# Altium footprint library General.PcbLib: 446 footprints (part 20 of 28)
Each footprint in its own frame and in the unit in brackets; x right, y up, seen from the top. Pads: shape width x height; smd on the part's side, far side on the other; paste and mask are expansions set on the pad; w line width, h text height; cw(c..) or ccw(c..) is an arc to the next point about the centre after c.
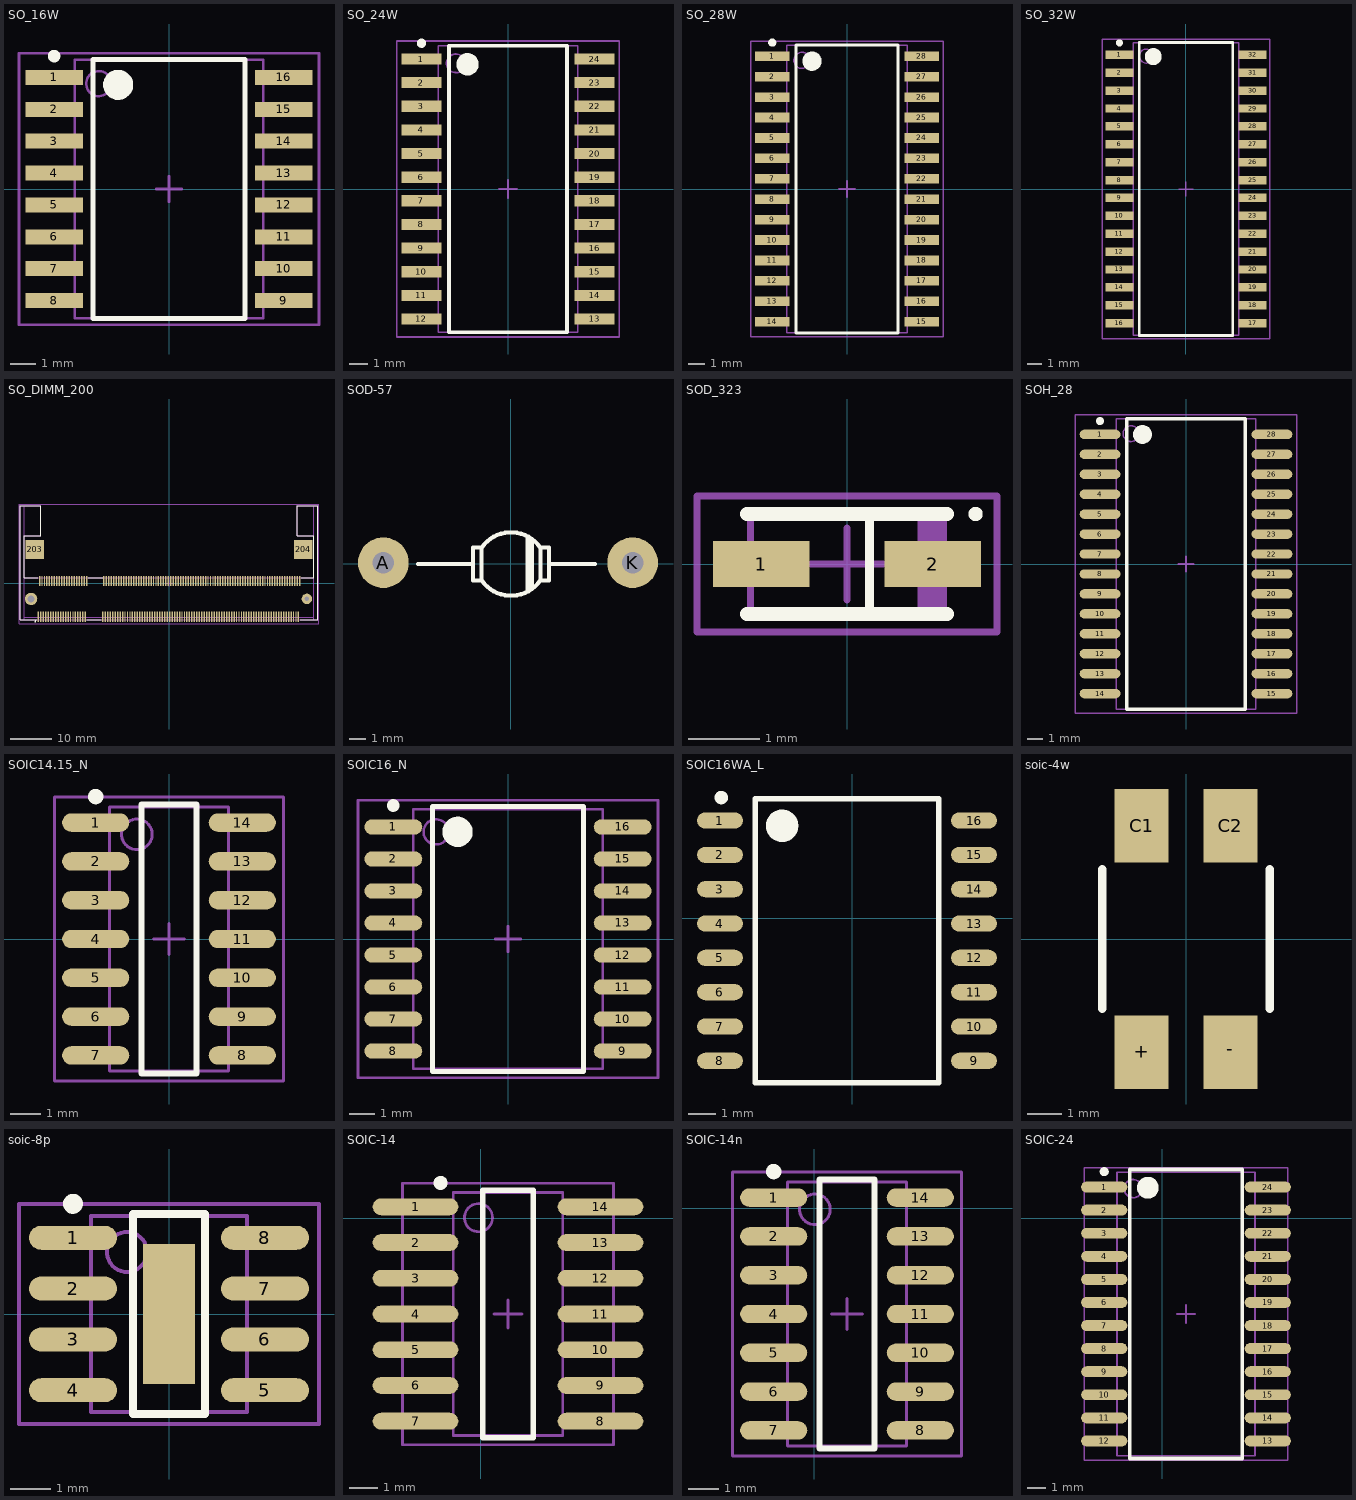
[diagram p19: the footprints below, top view; thin cyan lines are the x and y axes]

## SO_16W [mm] "SOIC, 16-Leads, Body 10.3x7.5mm (max), Pitch 1.27mm, IPC Medium Density"
height 2.4
pads (16):
  rect 2.3x0.6 smd: 1(-4.575,4.445) 2(-4.575,3.175) 3(-4.575,1.905) 4(-4.575,0.635) 5(-4.575,-0.635) 6(-4.575,-1.905) 7(-4.575,-3.175) 8(-4.575,-4.445) 9(4.575,-4.445) 10(4.575,-3.175) 11(4.575,-1.905) 12(4.575,-0.635) 13(4.575,0.635) 14(4.575,1.905) 15(4.575,3.175) 16(4.575,4.445)
Top Overlay:
  circle w0.6: c-2.025,4.15 r0.3
  circle w0.25: c-4.575,5.295 r0.125
  lines w0.2: -3.025,-5.15 3.025,-5.15 3.025,5.15 -3.025,5.15 -3.025,-5.15
Mechanical 13:
  circle w0.1: c-2.8,4.2 r0.5
  lines w0.1: -3.75,-5.15 3.75,-5.15 3.75,5.15 -3.75,5.15 -3.75,-5.15
Mechanical 15:
  lines w0.1: -0.5,0 0.5,0 ; 0,-0.5 0,0.5 ; -5.975,-5.4 5.975,-5.4 5.975,5.4 -5.975,5.4 -5.975,-5.4
3D body "SW3DPS-SOL-16-DEFAULT.STEP": height 1.75, standoff 0, extent -4.648,-4.851 4.652,5.149

## SO_24W [mm] "SOIC, 24-Leads, Body 15.4x7.5mm (max), Pitch 1.27mm, IPC Medium Density"
height 2.4
pads (24):
  rect 2.15x0.6 smd: 1(-4.65,6.985) 2(-4.65,5.715) 3(-4.65,4.445) 4(-4.65,3.175) 5(-4.65,1.905) 6(-4.65,0.635) 7(-4.65,-0.635) 8(-4.65,-1.905) 9(-4.65,-3.175) 10(-4.65,-4.445) 11(-4.65,-5.715) 12(-4.65,-6.985) 13(4.65,-6.985) 14(4.65,-5.715) 15(4.65,-4.445) 16(4.65,-3.175) 17(4.65,-1.905) 18(4.65,-0.635) 19(4.65,0.635) 20(4.65,1.905) 21(4.65,3.175) 22(4.65,4.445) 23(4.65,5.715) 24(4.65,6.985)
Top Overlay:
  circle w0.25: c-4.65,7.835 r0.125
  circle w0.6: c-2.175,6.7 r0.3
  lines w0.2: -3.175,-7.7 -3.175,7.7 3.175,7.7 3.175,-7.7 -3.175,-7.7
Mechanical 13:
  circle w0.1: c-2.8,6.75 r0.5
  lines w0.1: -3.75,-7.7 -3.75,7.7 3.75,7.7 3.75,-7.7 -3.75,-7.7
Mechanical 15:
  lines w0.1: -0.5,0 0.5,0 ; 0,-0.5 0,0.5 ; -5.975,-7.95 -5.975,7.95 5.975,7.95 5.975,-7.95 -5.975,-7.95
3D body: height 2.4, standoff 0.2, extent -3.75,-7.7 3.75,7.7

## SO_28W [mm] "SOIC, 28-Leads, Body 17.9x7.5mm (max), Pitch 1.27mm, IPC Medium Density"
height 1.75
pads (28):
  rect 2.15x0.6 smd: 1(-4.65,8.255) 2(-4.65,6.985) 3(-4.65,5.715) 4(-4.65,4.445) 5(-4.65,3.175) 6(-4.65,1.905) 7(-4.65,0.635) 8(-4.65,-0.635) 9(-4.65,-1.905) 10(-4.65,-3.175) 11(-4.65,-4.445) 12(-4.65,-5.715) 13(-4.65,-6.985) 14(-4.65,-8.255) 15(4.65,-8.255) 16(4.65,-6.985) 17(4.65,-5.715) 18(4.65,-4.445) 19(4.65,-3.175) 20(4.65,-1.905) 21(4.65,-0.635) 22(4.65,0.635) 23(4.65,1.905) 24(4.65,3.175) 25(4.65,4.445) 26(4.65,5.715) 27(4.65,6.985) 28(4.65,8.255)
Top Overlay:
  circle w0.6: c-2.175,7.95 r0.3
  circle w0.25: c-4.65,9.105 r0.125
  lines w0.2: -3.175,-8.95 3.175,-8.95 3.175,8.95 -3.175,8.95 -3.175,-8.95
Mechanical 13:
  circle w0.1: c-2.8,8 r0.5
  lines w0.1: -3.75,-8.95 3.75,-8.95 3.75,8.95 -3.75,8.95 -3.75,-8.95
Mechanical 15:
  lines w0.1: -0.5,0 0.5,0 ; 0,-0.5 0,0.5 ; -5.975,-9.2 5.975,-9.2 5.975,9.2 -5.975,9.2 -5.975,-9.2
3D body "SW3DPS-SOL-28-DEFAULT.STEP": height 1.75, standoff 0, extent -4.623,-8.814 4.677,8.946

## SO_32W [mm] "SOIC, 32-Leads, Body 20.8x7.5mm (max), Pitch 1.27mm, IPC Medium Density"
height 2.413
pads (32):
  rect 2x0.6 smd: 1(-4.725,9.525) 2(-4.725,8.255) 3(-4.725,6.985) 4(-4.725,5.715) 5(-4.725,4.445) 6(-4.725,3.175) 7(-4.725,1.905) 8(-4.725,0.635) 9(-4.725,-0.635) 10(-4.725,-1.905) 11(-4.725,-3.175) 12(-4.725,-4.445) 13(-4.725,-5.715) 14(-4.725,-6.985) 15(-4.725,-8.255) 16(-4.725,-9.525) 17(4.725,-9.525) 18(4.725,-8.255) 19(4.725,-6.985) 20(4.725,-5.715) 21(4.725,-4.445) 22(4.725,-3.175) 23(4.725,-1.905) 24(4.725,-0.635) 25(4.725,0.635) 26(4.725,1.905) 27(4.725,3.175) 28(4.725,4.445) 29(4.725,5.715) 30(4.725,6.985) 31(4.725,8.255) 32(4.725,9.525)
Top Overlay:
  circle w0.25: c-4.725,10.375 r0.125
  circle w0.6: c-2.325,9.4 r0.3
  lines w0.2: -3.325,-10.4 -3.325,10.4 3.325,10.4 3.325,-10.4 -3.325,-10.4
Mechanical 13:
  circle w0.1: c-2.81,9.44 r0.5
  lines w0.1: -3.76,-10.39 -3.76,10.39 3.76,10.39 3.76,-10.39 -3.76,-10.39
Mechanical 15:
  lines w0.1: -0.5,0 0.5,0 ; 0,-0.5 0,0.5 ; -5.95,-10.65 -5.95,10.65 5.95,10.65 5.95,-10.65 -5.95,-10.65
3D body: height 2.41, standoff 0.18, extent -3.76,-10.39 3.76,10.39

## SO_DIMM_200 [mm] "Connector; DMD Series; 200 Position; 0.6mm Spaced Top Contact"
height 5.2
pads (204):
  rect 0.35x2.5 smd: 1(-31.65,-8.175) 2(-31.35,0.525) 3(-31.05,-8.175) 4(-30.75,0.525) 5(-30.45,-8.175) 6(-30.15,0.525) 7(-29.85,-8.175) 8(-29.55,0.525) 9(-29.25,-8.175) 10(-28.95,0.525) 11(-28.65,-8.175) 12(-28.35,0.525) 13(-28.05,-8.175) 14(-27.75,0.525) 15(-27.45,-8.175) 16(-27.15,0.525) 17(-26.85,-8.175) 18(-26.55,0.525) 19(-26.25,-8.175) 20(-25.95,0.525) 21(-25.65,-8.175) 22(-25.35,0.525) 23(-25.05,-8.175) 24(-24.75,0.525) 25(-24.45,-8.175) 26(-24.15,0.525) 27(-23.85,-8.175) 28(-23.55,0.525) 29(-23.25,-8.175) 30(-22.95,0.525) 31(-22.65,-8.175) 32(-22.35,0.525) 33(-22.05,-8.175) 34(-21.75,0.525) 35(-21.45,-8.175) 36(-21.15,0.525) 37(-20.85,-8.175) 38(-20.55,0.525) 39(-20.25,-8.175) 40(-19.95,0.525) 41(-16.05,-8.175) 42(-15.75,0.525) 43(-15.45,-8.175) 44(-15.15,0.525) 45(-14.85,-8.175) 46(-14.55,0.525) 47(-14.25,-8.175) 48(-13.95,0.525) 49(-13.65,-8.175) 50(-13.35,0.525) 51(-13.05,-8.175) 52(-12.75,0.525) 53(-12.45,-8.175) 54(-12.15,0.525) 55(-11.85,-8.175) 56(-11.55,0.525) 57(-11.25,-8.175) 58(-10.95,0.525) 59(-10.65,-8.175) 60(-10.35,0.525) 61(-10.05,-8.175) 62(-9.75,0.525) 63(-9.45,-8.175) 64(-9.15,0.525) 65(-8.85,-8.175) 66(-8.55,0.525) 67(-8.25,-8.175) 68(-7.95,0.525) 69(-7.65,-8.175) 70(-7.35,0.525) 71(-7.05,-8.175) 72(-6.75,0.525) 73(-6.45,-8.175) 74(-6.15,0.525) 75(-5.85,-8.175) 76(-5.55,0.525) 77(-5.25,-8.175) 78(-4.95,0.525) 79(-4.65,-8.175) 80(-4.35,0.525) 81(-4.05,-8.175) 82(-3.75,0.525) 83(-3.45,-8.175) 84(-3.15,0.525) 85(-2.85,-8.175) 86(-2.55,0.525) 87(-2.25,-8.175) 88(-1.95,0.525) 89(-1.65,-8.175) 90(-1.35,0.525) 91(-1.05,-8.175) 92(-0.75,0.525) 93(-0.45,-8.175) 94(-0.15,0.525) 95(0.15,-8.175) 96(0.45,0.525) 97(0.75,-8.175) 98(1.05,0.525) 99(1.35,-8.175) 100(1.65,0.525) 101(1.95,-8.175) 102(2.25,0.525) 103(2.55,-8.175) 104(2.85,0.525) 105(3.15,-8.175) 106(3.45,0.525) 107(3.75,-8.175) 108(4.05,0.525) 109(4.35,-8.175) 110(4.65,0.525) 111(4.95,-8.175) 112(5.25,0.525) 113(5.55,-8.175) 114(5.85,0.525) 115(6.15,-8.175) 116(6.45,0.525) 117(6.75,-8.175) 118(7.05,0.525) 119(7.35,-8.175) 120(7.65,0.525) 121(7.95,-8.175) 122(8.25,0.525) 123(8.55,-8.175) 124(8.85,0.525) 125(9.15,-8.175) 126(9.45,0.525) 127(9.75,-8.175) 128(10.05,0.525) 129(10.35,-8.175) 130(10.65,0.525) 131(10.95,-8.175) 132(11.25,0.525) 133(11.55,-8.175) 134(11.85,0.525) 135(12.15,-8.175) 136(12.45,0.525) 137(12.75,-8.175) 138(13.05,0.525) 139(13.35,-8.175) 140(13.65,0.525) 141(13.95,-8.175) 142(14.25,0.525) 143(14.55,-8.175) 144(14.85,0.525) 145(15.15,-8.175) 146(15.45,0.525) 147(15.75,-8.175) 148(16.05,0.525) 149(16.35,-8.175) 150(16.65,0.525) 151(16.95,-8.175) 152(17.25,0.525) 153(17.55,-8.175) 154(17.85,0.525) 155(18.15,-8.175) 156(18.45,0.525) 157(18.75,-8.175) 158(19.05,0.525) 159(19.35,-8.175) 160(19.65,0.525) 161(19.95,-8.175) 162(20.25,0.525) 163(20.55,-8.175) 164(20.85,0.525) 165(21.15,-8.175) 166(21.45,0.525) 167(21.75,-8.175) 168(22.05,0.525) 169(22.35,-8.175) 170(22.65,0.525) 171(22.95,-8.175) 172(23.25,0.525) 173(23.55,-8.175) 174(23.85,0.525) 175(24.15,-8.175) 176(24.45,0.525) 177(24.75,-8.175) 178(25.05,0.525) 179(25.35,-8.175) 180(25.65,0.525) 181(25.95,-8.175) 182(26.25,0.525) 183(26.55,-8.175) 184(26.85,0.525) 185(27.15,-8.175) 186(27.45,0.525) 187(27.75,-8.175) 188(28.05,0.525) 189(28.35,-8.175) 190(28.65,0.525) 191(28.95,-8.175) 192(29.25,0.525) 193(29.55,-8.175) 194(29.85,0.525) 195(30.15,-8.175) 196(30.45,0.525) 197(30.75,-8.175) 198(31.05,0.525) 199(31.35,-8.175) 200(31.65,0.525)
  round 2.997 hole 1.626: 201(-33.4,-3.825)
  round 2.54 hole 1.118: 202(33.4,-3.825)
  rect 4.5x4.6 smd: 203(-32.55,8.175) 204(32.55,8.175)
Top Overlay:
  circle w0.254: c-32.385,-9.322 r0.072
  lines w0.254: -32.028,-8.822 -36,-8.822 -36,18.728 -31,18.728 -31,11.498 -35.039,11.498 -35.039,1.255 -31.749,1.255 ; -19.862,-8.829 -16.458,-8.829 ; -19.582,1.255 -16.103,1.255 ; 31.726,-8.822 36,-8.822 36,18.728 31,18.728 31,11.498 35.014,11.498 35.014,1.255 31.98,1.255
Mechanical 13:
  lines w0.1: -35.04,-8.822 -35.04,1.254 ; -35.04,-8.255 35.014,-8.255 ; -35.04,11.498 -35.04,18.728 ; 34.798,1.254 35.015,1.254 ; 35.014,-8.822 35.014,1.255 ; 35.015,11.498 35.015,18.728 ; -35.039,1.255 -35.039,11.498 -31,11.498 -31,18.728 -36,18.728 -36,-8.822 -32.028,-8.822 36,-8.822 36,18.728 31,18.728 31,11.498 35.014,11.498 35.014,1.255 ; -35.039,1.255 31.98,1.255 35.014,1.255
Mechanical 15:
  lines w0.1: -0.762,0 0,0 ; 0,-0.762 0,0 ; 0,0.762 0,0 ; 0.762,0 0,0 ; -36.322,-9.779 36.322,-9.779 36.322,19.05 -36.322,19.05 -36.322,-9.779
3D body: height 5.2, standoff 0, extent -35.039,-8.822 35.013,-8.256
3D body: height 1.6, standoff 0, extent -35.999,-8.822 35.999,18.727
3D body: height 5.2, standoff 3.6, extent -35.999,-8.822 35.999,18.727
3D body: height 5.2, standoff 0, extent -35.999,-8.822 -35.04,18.727
3D body: height 5.2, standoff 0, extent 35.015,-8.822 35.999,18.727

## SOD-57 [mil]
pads (2):
  round 120 hole 51.18: A(-302,3) K(288,3)
Top Overlay:
  lines w10: -220,0 -90,0 ; 40,-65 40,65 ; 45,-60 45,60 ; 50,-55 50,55 ; 90,0 199,0 ; -69.63,-38.75 ccw(c0,10) 69.63,-38.75 ; -69.63,-38.75 -90,-38.75 -90,38.75 -69.63,38.75 ; -69.63,-38.75 -69.63,38.75 ; -69.63,38.75 cw(c0,-10) 69.63,38.75 ; 69.63,-38.75 90,-38.75 90,38.75 69.63,38.75 ; 69.63,-38.75 69.63,38.75
3D body "User Library-BYV28-200_.STEP": height 206.69, standoff -78.74, extent -327.85,-84.57 315.85,92.59

## SOD_323 [mm] "Molded Diode, 2-Leads, Body 2.5x1.3mm, IPC Medium Density"
height 1.1
pads (2):
  rect 1.35x0.65 smd: 1(-1.2,0) 2(1.2,0)
Top Overlay:
  circle w0.1: c1.8,0.7 r0.05
  rectangle: 0.254,-0.762 0.381,0.762
  lines w0.2: -1.4,-0.7 1.4,-0.7 ; -1.4,0.7 1.4,0.7
Mechanical 13:
  rectangle: 0.987,-0.7 1.35,0.7
  lines w0.1: -1.35,-0.7 1.35,-0.7 1.35,0.7 -1.35,0.7 -1.35,-0.7
Mechanical 15:
  lines w0.1: -0.5,0 0.5,0 ; 0,-0.5 0,0.5 ; -2.1,-0.95 2.1,-0.95 2.1,0.95 -2.1,0.95 -2.1,-0.95
3D body: height 1.1, standoff 0, extent -1.35,-0.7 1.35,0.7
3D body: height 1.11, standoff 1.1, extent 0.559,-0.7 0.914,0.7

## SOH_28 [mm] "SOIC, 28-Leads, Body 18.5x8.9mm (max), Pitch 1.27mm, IPC Medium Density"
height 3
pads (28):
  oval 2.6x0.6 smd: 1(-5.475,8.255) 2(-5.475,6.985) 3(-5.475,5.715) 4(-5.475,4.445) 5(-5.475,3.175) 6(-5.475,1.905) 7(-5.475,0.635) 8(-5.475,-0.635) 9(-5.475,-1.905) 10(-5.475,-3.175) 11(-5.475,-4.445) 12(-5.475,-5.715) 13(-5.475,-6.985) 14(-5.475,-8.255) 15(5.475,-8.255) 16(5.475,-6.985) 17(5.475,-5.715) 18(5.475,-4.445) 19(5.475,-3.175) 20(5.475,-1.905) 21(5.475,-0.635) 22(5.475,0.635) 23(5.475,1.905) 24(5.475,3.175) 25(5.475,4.445) 26(5.475,5.715) 27(5.475,6.985) 28(5.475,8.255)
Top Overlay:
  circle w0.25: c-5.475,9.105 r0.125
  circle w0.6: c-2.775,8.25 r0.3
  lines w0.2: -3.775,-9.25 -3.775,9.25 3.775,9.25 3.775,-9.25 -3.775,-9.25
Mechanical 13:
  circle w0.1: c-3.5,8.3 r0.5
  lines w0.1: -4.45,-9.25 -4.45,9.25 4.45,9.25 4.45,-9.25 -4.45,-9.25
Mechanical 15:
  lines w0.1: -0.5,0 0.5,0 ; 0,-0.5 0,0.5 ; -7.05,-9.5 -7.05,9.5 7.05,9.5 7.05,-9.5 -7.05,-9.5
3D body: height 3, standoff 0.1, extent -4.45,-9.25 4.45,9.25

## SOIC14.15_N [mm]
pads (14):
  oval 2.2x0.6 smd: 1(-2.4,3.81) 2(-2.4,2.54) 3(-2.4,1.27) 4(-2.4,0) 5(-2.4,-1.27) 6(-2.4,-2.54) 7(-2.4,-3.81) 8(2.4,-3.81) 9(2.4,-2.54) 10(2.4,-1.27) 11(2.4,0) 12(2.4,1.27) 13(2.4,2.54) 14(2.4,3.81)
Top Overlay:
  circle w0.25: c-2.4,4.66 r0.125
  lines w0.2: -0.9,-4.4 -0.9,4.4 0.9,4.4 0.9,-4.4 -0.9,-4.4
Mechanical 13:
  circle w0.1: c-1.05,3.425 r0.5
  lines w0.1: -1.95,-4.325 -1.95,4.325 1.95,4.325 1.95,-4.325 -1.95,-4.325
Mechanical 15:
  lines w0.1: -0.5,0 0.5,0 ; 0,-0.5 0,0.5 ; -3.75,-4.65 -3.75,4.65 3.75,4.65 3.75,-4.65 -3.75,-4.65
3D body: height 1.75, standoff 0, extent -1.95,-4.325 1.95,4.325

## SOIC16_N [mm] "SOIC, 16-Leads, Body 10.3x7.5mm, Pitch 1.27mm, IPC Medium Density"
height 2.65
pads (16):
  oval 2.3x0.6 smd: 1(-4.55,4.445) 2(-4.55,3.175) 3(-4.55,1.905) 4(-4.55,0.635) 5(-4.55,-0.635) 6(-4.55,-1.905) 7(-4.55,-3.175) 8(-4.55,-4.445) 9(4.55,-4.445) 10(4.55,-3.175) 11(4.55,-1.905) 12(4.55,-0.635) 13(4.55,0.635) 14(4.55,1.905) 15(4.55,3.175) 16(4.55,4.445)
Top Overlay:
  circle w0.25: c-4.55,5.295 r0.125
  circle w0.6: c-2,4.25 r0.3
  lines w0.2: -3,-5.25 -3,5.25 3,5.25 3,-5.25 -3,-5.25
Mechanical 13:
  circle w0.1: c-2.85,4.25 r0.5
  lines w0.1: -3.75,-5.15 -3.75,5.15 3.75,5.15 3.75,-5.15 -3.75,-5.15
Mechanical 15:
  lines w0.1: -0.5,0 0.5,0 ; 0,-0.5 0,0.5 ; -5.95,-5.5 -5.95,5.5 5.95,5.5 5.95,-5.5 -5.95,-5.5
3D body: height 2.65, standoff 0, extent -3.75,-5.15 3.75,5.15

## SOIC16WA_L [mm]
pads (16):
  oval 1.7x0.6 smd: 1(-4.889,3.619) 2(-4.889,2.349) 3(-4.889,1.079) 4(-4.889,-0.191) 5(-4.889,-1.46) 6(-4.889,-2.73) 7(-4.889,-4) 8(-4.889,-5.271) 9(4.508,-5.271) 10(4.508,-4) 11(4.508,-2.73) 12(4.508,-1.46) 13(4.508,-0.191) 14(4.508,1.079) 15(4.508,2.349) 16(4.508,3.619)
Top Overlay:
  circle w0.6: c-2.59,3.424 r0.3
  circle w0.25: c-4.84,4.47 r0.125
  lines w0.2: -3.59,-6.075 3.21,-6.075 3.21,4.424 -3.59,4.424 -3.59,-6.075
3D body: height 2, standoff 0, extent -3.708,-6.172 3.302,4.521

## soic-4w [mm] "minidip-4(bridge)"
pads (4):
  rect 1.55x2.1 smd: +(-1.27,-3.25) -(1.27,-3.25) C1(-1.27,3.25) C2(1.27,3.25)
Top Overlay:
  lines w0.254: -2.4,-2 -2.4,0 -2.4,2 ; 2.4,-2 2.4,0 2.4,2
3D body "SOP4.step": height 2.9, standoff 0, extent -2.475,-3.343 2.475,3.343

## soic-8p [mm] "with center pad"
pads (9):
  oval 2.2x0.6 smd: 1(-2.4,1.905) 2(-2.4,0.635) 3(-2.4,-0.635) 4(-2.4,-1.905) 5(2.4,-1.905) 6(2.4,-0.635) 7(2.4,0.635) 8(2.4,1.905)
  rect 1.3x3.5 smd: ""(0,0)
Top Overlay:
  circle w0.25: c-2.4,2.755 r0.125
  lines w0.2: -0.9,-2.5 -0.9,2.5 0.9,2.5 0.9,-2.5 -0.9,-2.5
Mechanical 13:
  circle w0.1: c-1.05,1.55 r0.5
  lines w0.1: -1.95,-2.45 -1.95,2.45 1.95,2.45 1.95,-2.45 -1.95,-2.45
Mechanical 15:
  lines w0.1: -0.5,0 0.5,0 ; 0,-0.5 0,0.5 ; -3.75,-2.75 -3.75,2.75 3.75,2.75 3.75,-2.75 -3.75,-2.75
3D body "SW3DPS-SO-8-DEFAULT.STEP": height 1.45, standoff 0, extent -2.914,-2.438 2.864,2.464

## SOIC-14 [mil]
pads (14):
  oval 120x23.62 smd: 1(-91.49,16) 2(-91.49,-34) 3(-91.49,-84) 4(-91.49,-134) 5(-91.49,-184) 6(-91.49,-234) 7(-91.49,-284) 8(167.49,-284) 9(167.49,-234) 10(167.49,-184) 11(167.49,-134) 12(167.49,-84) 13(167.49,-34) 14(167.49,16)
Top Overlay:
  circle w9.84: c-56.49,49.46 r4.92
  lines w7.87: 2.57,-307.23 2.57,39.23 73.43,39.23 73.43,-307.23 2.57,-307.23
Mechanical 13:
  circle w3.94: c-3.34,0.84 r19.68
  lines w3.94: -38.77,-304.28 -38.77,36.28 114.77,36.28 114.77,-304.28 -38.77,-304.28
Mechanical 15:
  lines w3.94: 18.31,-134 57.69,-134 ; 38,-153.68 38,-114.31 ; -109.64,-317.07 -109.64,49.07 185.64,49.07 185.64,-317.07 -109.64,-317.07
3D body: height 68.9, standoff 0, extent -38.77,-304.28 114.77,36.28

## SOIC-14n [mm]
pads (14):
  oval 2.2x0.6 smd: 1(-1.333,0.356) 2(-1.333,-0.914) 3(-1.333,-2.184) 4(-1.333,-3.454) 5(-1.333,-4.724) 6(-1.333,-5.994) 7(-1.333,-7.264) 8(3.467,-7.264) 9(3.467,-5.994) 10(3.467,-4.724) 11(3.467,-3.454) 12(3.467,-2.184) 13(3.467,-0.914) 14(3.467,0.356)
Top Overlay:
  circle w0.25: c-1.333,1.206 r0.125
  lines w0.2: 0.167,-7.854 1.967,-7.854 1.967,0.946 0.167,0.946 0.167,-7.854
Mechanical 13:
  circle w0.1: c0.017,-0.029 r0.5
  lines w0.1: -0.883,-7.779 3.017,-7.779 3.017,0.871 -0.883,0.871 -0.883,-7.779
Mechanical 15:
  lines w0.1: 0.567,-3.454 1.567,-3.454 ; 1.067,-3.954 1.067,-2.954 ; -2.683,-8.104 4.817,-8.104 4.817,1.196 -2.683,1.196 -2.683,-8.104
3D body: height 1.75, standoff 0, extent -0.883,-7.779 3.017,0.871

## SOIC-24 [mm]
pads (24):
  oval 2.54x0.6 smd: 1(-3.205,1.702) 2(-3.205,0.432) 3(-3.205,-0.838) 4(-3.205,-2.108) 5(-3.205,-3.378) 6(-3.205,-4.648) 7(-3.205,-5.918) 8(-3.205,-7.188) 9(-3.205,-8.458) 10(-3.205,-9.728) 11(-3.205,-10.998) 12(-3.205,-12.268) 13(5.795,-12.268) 14(5.795,-10.998) 15(5.795,-9.728) 16(5.795,-8.458) 17(5.795,-7.188) 18(5.795,-5.918) 19(5.795,-4.648) 20(5.795,-3.378) 21(5.795,-2.108) 22(5.795,-0.838) 23(5.795,0.432) 24(5.795,1.702)
Top Overlay:
  circle w0.6: c-0.805,1.667 r0.3
  circle w0.25: c-3.205,2.552 r0.125
  lines w0.2: -1.805,-13.233 4.395,-13.233 4.395,2.667 -1.805,2.667 -1.805,-13.233
Mechanical 13:
  circle w0.1: c-1.605,1.617 r0.5
  lines w0.1: -2.505,-13.083 5.095,-13.083 5.095,2.517 -2.505,2.517 -2.505,-13.083
Mechanical 15:
  lines w0.1: 0.795,-5.283 1.795,-5.283 ; 1.295,-5.783 1.295,-4.783 ; -4.305,-13.333 6.895,-13.333 6.895,2.767 -4.305,2.767 -4.305,-13.333
3D body: height 2.65, standoff 0, extent -2.505,-13.083 5.095,2.517